# Altium schematic symbol library Capacitor - Aluminium TH.SchLib: 4591 symbols (part 4 of 27) (continued)
## 860160275035
designator C?, comment 1800uF  (value not drawn)
CAP 1800 UF 20% 10 V; Part Number: 860160275035; Manufacturer: Wurth Electronics Inc; TemperatureRange: -55C ~ 105C; Voltage: 10V; Type: Polar; Ripple Current: 1.65A @ 100kHz; Impedance: 102 mOhm; Value: 1800uF; PartId: 26047; Supplier 1: Digi-Key; Supplier Part Number 1: 732-9440-3-ND; ComponentLink1Description: Datasheet; ComponentLink1URL: http://katalog.we-online.de/pbs/datasheet/860160275035.pdf; ComponentLink2Description: Digi-Key Listing; ComponentLink2URL: https://www.digikey.com/product-detail/en/wurth-electronics-inc/860160275035/732-9440-3-ND/5727670; Tolerance: 20%; Price: 0.6174; Device Package: Radial, Can, 10mm
footprint CAP AL TH D10 L5 H30
pins: 1, 2

## 860160280045
designator C?, comment 4700uF  (value not drawn)
CAP 4700 UF 20% 10 V; Part Number: 860160280045; Manufacturer: Wurth Electronics Inc; TemperatureRange: -55C ~ 105C; Voltage: 10V; Type: Polar; Ripple Current: 2.634A @ 100kHz; Impedance: 57 mOhm; Value: 4700uF; PartId: 26696; Supplier 1: Digi-Key; Supplier Part Number 1: 732-9450-3-ND; ComponentLink1Description: Datasheet; ComponentLink1URL: http://katalog.we-online.de/pbs/datasheet/860160280045.pdf; ComponentLink2Description: Digi-Key Listing; ComponentLink2URL: https://www.digikey.com/product-detail/en/wurth-electronics-inc/860160280045/732-9450-3-ND/5727680; Tolerance: 20%; Price: 1.8979; Device Package: Radial, Can, 16mm
footprint CAP AL TH D16 L7.5 H26.5
pins: 1, 2

## 860160280047
designator C?, comment 5600uF  (value not drawn)
CAP 5600 UF 20% 10 V; Part Number: 860160280047; Manufacturer: Wurth Electronics Inc; TemperatureRange: -55C ~ 105C; Voltage: 10V; Type: Polar; Ripple Current: 2.736A @ 100kHz; Impedance: 50 mOhm; Value: 5600uF; PartId: 27256; Supplier 1: Digi-Key; Supplier Part Number 1: 732-9452-3-ND; ComponentLink1Description: Datasheet; ComponentLink1URL: http://katalog.we-online.de/pbs/datasheet/860160280047.pdf; ComponentLink2Description: Digi-Key Listing; ComponentLink2URL: https://www.digikey.com/product-detail/en/wurth-electronics-inc/860160280047/732-9452-3-ND/5727682; Tolerance: 20%; Price: 2.7331; Device Package: Radial, Can, 16mm
footprint CAP AL TH D16 L7.5 H33.5
pins: 1, 2

## 860160280048
designator C?, comment 6800uF  (value not drawn)
CAP 6800 UF 20% 10 V; Part Number: 860160280048; Manufacturer: Wurth Electronics Inc; TemperatureRange: -55C ~ 105C; Voltage: 10V; Type: Polar; Ripple Current: 2.964A @ 100kHz; Impedance: 46 mOhm; Value: 6800uF; PartId: 27288; Supplier 1: Digi-Key; Supplier Part Number 1: 732-9453-3-ND; ComponentLink1Description: Datasheet; ComponentLink1URL: http://katalog.we-online.de/pbs/datasheet/860160280048.pdf; ComponentLink2Description: Digi-Key Listing; ComponentLink2URL: https://www.digikey.com/product-detail/en/wurth-electronics-inc/860160280048/732-9453-3-ND/5727683; Tolerance: 20%; Price: 3.2803; Device Package: Radial, Can, 16mm
footprint CAP AL TH D16 L7.5 H33.5
pins: 1, 2

## 860160375023
designator C?, comment 390uF  (value not drawn)
CAP 390 UF 20% 16 V; Part Number: 860160375023; Manufacturer: Wurth Electronics Inc; TemperatureRange: -55C ~ 105C; Voltage: 16V; Type: Polar; Ripple Current: 648mA @ 100kHz; Impedance: 330 mOhm; Value: 390uF; PartId: 24891; Supplier 1: Digi-Key; Supplier Part Number 1: 732-9476-1-ND; ComponentLink1Description: Datasheet; ComponentLink1URL: http://katalog.we-online.de/pbs/datasheet/860160375023.pdf; ComponentLink2Description: Digi-Key Listing; ComponentLink2URL: https://www.digikey.com/product-detail/en/wurth-electronics-inc/860160375023/732-9476-1-ND/5729414; Tolerance: 20%; Price: 0.48; Device Package: Radial, Can, 10mm
footprint CAP AL TH D10 L5 H14.5
pins: 1, 2

## 860160375025
designator C?, comment 470uF  (value not drawn)
CAP 470 UF 20% 16 V; Part Number: 860160375025; Manufacturer: Wurth Electronics Inc; TemperatureRange: -55C ~ 105C; Voltage: 16V; Type: Polar; Ripple Current: 882mA @ 100kHz; Impedance: 280 mOhm; Value: 470uF; PartId: 24981; Supplier 1: Digi-Key; Supplier Part Number 1: 732-9478-1-ND; ComponentLink1Description: Datasheet; ComponentLink1URL: http://katalog.we-online.de/pbs/datasheet/860160375025.pdf; ComponentLink2Description: Digi-Key Listing; ComponentLink2URL: https://www.digikey.com/product-detail/en/wurth-electronics-inc/860160375025/732-9478-1-ND/5729416; Tolerance: 20%; Price: 0.54; Device Package: Radial, Can, 10mm
footprint CAP AL TH D10 L5 H14.5
pins: 1, 2

## 860160375027
designator C?, comment 560uF  (value not drawn)
CAP 560 UF 20% 16 V; Part Number: 860160375027; Manufacturer: Wurth Electronics Inc; TemperatureRange: -55C ~ 105C; Voltage: 16V; Type: Polar; Ripple Current: 882mA @ 100kHz; Impedance: 240 mOhm; Value: 560uF; PartId: 24680; Supplier 1: Digi-Key; Supplier Part Number 1: 732-9480-3-ND; ComponentLink1Description: Datasheet; ComponentLink1URL: http://katalog.we-online.de/pbs/datasheet/860160375027.pdf; ComponentLink2Description: Digi-Key Listing; ComponentLink2URL: https://www.digikey.com/product-detail/en/wurth-electronics-inc/860160375027/732-9480-3-ND/5727710; Tolerance: 20%; Price: 0.3276; Device Package: Radial, Can, 10mm
footprint CAP AL TH D10 L5 H14.5
pins: 1, 2

## 860160375029
designator C?, comment 680uF  (value not drawn)
CAP 680 UF 20% 16 V; Part Number: 860160375029; Manufacturer: Wurth Electronics Inc; TemperatureRange: -55C ~ 105C; Voltage: 16V; Type: Polar; Ripple Current: 1.044A @ 100kHz; Impedance: 180 mOhm; Value: 680uF; PartId: 25137; Supplier 1: Digi-Key; Supplier Part Number 1: 732-9482-3-ND; ComponentLink1Description: Datasheet; ComponentLink1URL: http://katalog.we-online.de/pbs/datasheet/860160375029.pdf; ComponentLink2Description: Digi-Key Listing; ComponentLink2URL: https://www.digikey.com/product-detail/en/wurth-electronics-inc/860160375029/732-9482-3-ND/5727712; Tolerance: 20%; Price: 0.3729; Device Package: Radial, Can, 10mm
footprint CAP AL TH D10 L5 H17.5
pins: 1, 2

## 860160375031
designator C?, comment 820uF  (value not drawn)
CAP 820 UF 20% 16 V; Part Number: 860160375031; Manufacturer: Wurth Electronics Inc; TemperatureRange: -55C ~ 105C; Voltage: 16V; Type: Polar; Ripple Current: 1.254A @ 100kHz; Impedance: 150 mOhm; Value: 820uF; PartId: 25143; Supplier 1: Digi-Key; Supplier Part Number 1: 732-9484-3-ND; ComponentLink1Description: Datasheet; ComponentLink1URL: http://katalog.we-online.de/pbs/datasheet/860160375031.pdf; ComponentLink2Description: Digi-Key Listing; ComponentLink2URL: https://www.digikey.com/product-detail/en/wurth-electronics-inc/860160375031/732-9484-3-ND/5727714; Tolerance: 20%; Price: 0.4032; Device Package: Radial, Can, 10mm
footprint CAP AL TH D10 L5 H17.5
pins: 1, 2

## 860160375034
designator C?, comment 1500uF  (value not drawn)
CAP 1500 UF 20% 16 V; Part Number: 860160375034; Manufacturer: Wurth Electronics Inc; TemperatureRange: -55C ~ 105C; Voltage: 16V; Type: Polar; Ripple Current: 1.62A @ 100kHz; Impedance: 96 mOhm; Value: 1500uF; PartId: 26083; Supplier 1: Digi-Key; Supplier Part Number 1: 732-9487-3-ND; ComponentLink1Description: Datasheet; ComponentLink1URL: http://katalog.we-online.de/pbs/datasheet/860160375034.pdf; ComponentLink2Description: Digi-Key Listing; ComponentLink2URL: https://www.digikey.com/product-detail/en/wurth-electronics-inc/860160375034/732-9487-3-ND/5727717; Tolerance: 20%; Price: 0.7207; Device Package: Radial, Can, 10mm
footprint CAP AL TH D10 L5 H30
pins: 1, 2

## 860160380041
designator C?, comment 3300uF  (value not drawn)
CAP 3300 UF 20% 16 V; Part Number: 860160380041; Manufacturer: Wurth Electronics Inc; TemperatureRange: -55C ~ 105C; Voltage: 16V; Type: Polar; Ripple Current: 2.7A @ 100kHz; Impedance: 64 mOhm; Value: 3300uF; PartId: 26598; Supplier 1: Digi-Key; Supplier Part Number 1: 732-9494-3-ND; ComponentLink1Description: Datasheet; ComponentLink1URL: http://katalog.we-online.de/pbs/datasheet/860160380041.pdf; ComponentLink2Description: Digi-Key Listing; ComponentLink2URL: https://www.digikey.com/product-detail/en/wurth-electronics-inc/860160380041/732-9494-3-ND/5727724; Tolerance: 20%; Price: 1.3248; Device Package: Radial, Can, 16mm
footprint CAP AL TH D16 L7.5 H26.5
pins: 1, 2

## 860160380043
designator C?, comment 3900uF  (value not drawn)
CAP 3900 UF 20% 16 V; Part Number: 860160380043; Manufacturer: Wurth Electronics Inc; TemperatureRange: -55C ~ 105C; Voltage: 16V; Type: Polar; Ripple Current: 2.736A @ 100kHz; Impedance: 60 mOhm; Value: 3900uF; PartId: 26687; Supplier 1: Digi-Key; Supplier Part Number 1: 732-9496-3-ND; ComponentLink1Description: Datasheet; ComponentLink1URL: http://katalog.we-online.de/pbs/datasheet/860160380043.pdf; ComponentLink2Description: Digi-Key Listing; ComponentLink2URL: https://www.digikey.com/product-detail/en/wurth-electronics-inc/860160380043/732-9496-3-ND/5727726; Tolerance: 20%; Price: 1.8173; Device Package: Radial, Can, 16mm
footprint CAP AL TH D16 L7.5 H26.5
pins: 1, 2

## 860160475020
designator C?, comment 330uF  (value not drawn)
CAP 330 UF 20% 25 V; Part Number: 860160475020; Manufacturer: Wurth Electronics Inc; TemperatureRange: -55C ~ 105C; Voltage: 25V; Type: Polar; Ripple Current: 924mA @ 100kHz; Impedance: 240 mOhm; Value: 330uF; PartId: 24943; Supplier 1: Digi-Key; Supplier Part Number 1: 732-9520-1-ND; ComponentLink1Description: Datasheet; ComponentLink1URL: http://katalog.we-online.de/pbs/datasheet/860160475020.pdf; ComponentLink2Description: Digi-Key Listing; ComponentLink2URL: https://www.digikey.com/product-detail/en/wurth-electronics-inc/860160475020/732-9520-1-ND/5729458; Tolerance: 20%; Price: 0.51; Device Package: Radial, Can, 10mm
footprint CAP AL TH D10 L5 H14.5
pins: 1, 2

## 860160480032
designator C?, comment 1800uF  (value not drawn)
CAP 1800 UF 20% 25 V; Part Number: 860160480032; Manufacturer: Wurth Electronics Inc; TemperatureRange: -55C ~ 105C; Voltage: 25V; Type: Polar; Ripple Current: 2.34A @ 100kHz; Impedance: 58 mOhm; Value: 1800uF; PartId: 26647; Supplier 1: Digi-Key; Supplier Part Number 1: 732-9532-3-ND; ComponentLink1Description: Datasheet; ComponentLink1URL: http://katalog.we-online.de/pbs/datasheet/860160480032.pdf; ComponentLink2Description: Digi-Key Listing; ComponentLink2URL: https://www.digikey.com/product-detail/en/wurth-electronics-inc/860160480032/732-9532-3-ND/5727762; Tolerance: 20%; Price: 1.5321; Device Package: Radial, Can, 16mm
footprint CAP AL TH D16 L7.5 H26.5
pins: 1, 2

## 860160480037
designator C?, comment 3300uF  (value not drawn)
CAP 3300 UF 20% 25 V; Part Number: 860160480037; Manufacturer: Wurth Electronics Inc; TemperatureRange: -55C ~ 105C; Voltage: 25V; Type: Polar; Ripple Current: 3.204A @ 100kHz; Impedance: 38 mOhm; Value: 3300uF; PartId: 27236; Supplier 1: Digi-Key; Supplier Part Number 1: 732-9537-3-ND; ComponentLink1Description: Datasheet; ComponentLink1URL: http://katalog.we-online.de/pbs/datasheet/860160480037.pdf; ComponentLink2Description: Digi-Key Listing; ComponentLink2URL: https://www.digikey.com/product-detail/en/wurth-electronics-inc/860160480037/732-9537-3-ND/5727767; Tolerance: 20%; Price: 2.4998; Device Package: Radial, Can, 16mm
footprint CAP AL TH D16 L7.5 H33.5
pins: 1, 2

## 860160575016
designator C?, comment 150uF  (value not drawn)
CAP 150 UF 20% 35 V; Part Number: 860160575016; Manufacturer: Wurth Electronics Inc; TemperatureRange: -55C ~ 105C; Voltage: 35V; Type: Polar; Ripple Current: 720mA @ 100kHz; Impedance: 350 mOhm; Value: 150uF; PartId: 24970; Supplier 1: Digi-Key; Supplier Part Number 1: 732-9554-1-ND; ComponentLink1Description: Datasheet; ComponentLink1URL: http://katalog.we-online.de/pbs/datasheet/860160575016.pdf; ComponentLink2Description: Digi-Key Listing; ComponentLink2URL: https://www.digikey.com/product-detail/en/wurth-electronics-inc/860160575016/732-9554-1-ND/5729492; Tolerance: 20%; Price: 0.53; Device Package: Radial, Can, 10mm
footprint CAP AL TH D10 L5 H14.5
pins: 1, 2

## 860160575018
designator C?, comment 180uF  (value not drawn)
CAP 180 UF 20% 35 V; Part Number: 860160575018; Manufacturer: Wurth Electronics Inc; TemperatureRange: -55C ~ 105C; Voltage: 35V; Type: Polar; Ripple Current: 804mA @ 100kHz; Impedance: 320 mOhm; Value: 180uF; PartId: 24673; Supplier 1: Digi-Key; Supplier Part Number 1: 732-9556-3-ND; ComponentLink1Description: Datasheet; ComponentLink1URL: http://katalog.we-online.de/pbs/datasheet/860160575018.pdf; ComponentLink2Description: Digi-Key Listing; ComponentLink2URL: https://www.digikey.com/product-detail/en/wurth-electronics-inc/860160575018/732-9556-3-ND/5727786; Tolerance: 20%; Price: 0.3099; Device Package: Radial, Can, 10mm
footprint CAP AL TH D10 L5 H14.5
pins: 1, 2

## 860160575020
designator C?, comment 220uF  (value not drawn)
CAP 220 UF 20% 35 V; Part Number: 860160575020; Manufacturer: Wurth Electronics Inc; TemperatureRange: -55C ~ 105C; Voltage: 35V; Type: Polar; Ripple Current: 888mA @ 100kHz; Impedance: 240 mOhm; Value: 220uF; PartId: 24971; Supplier 1: Digi-Key; Supplier Part Number 1: 732-9558-1-ND; ComponentLink1Description: Datasheet; ComponentLink1URL: http://katalog.we-online.de/pbs/datasheet/860160575020.pdf; ComponentLink2Description: Digi-Key Listing; ComponentLink2URL: https://www.digikey.com/product-detail/en/wurth-electronics-inc/860160575020/732-9558-1-ND/5729496; Tolerance: 20%; Price: 0.53; Device Package: Radial, Can, 10mm
footprint CAP AL TH D10 L5 H14.5
pins: 1, 2

## 860160575026
designator C?, comment 560uF  (value not drawn)
CAP 560 UF 20% 35 V; Part Number: 860160575026; Manufacturer: Wurth Electronics Inc; TemperatureRange: -55C ~ 105C; Voltage: 35V; Type: Polar; Ripple Current: 1.572A @ 100kHz; Impedance: 96 mOhm; Value: 560uF; PartId: 26046; Supplier 1: Digi-Key; Supplier Part Number 1: 732-9564-3-ND; ComponentLink1Description: Datasheet; ComponentLink1URL: http://katalog.we-online.de/pbs/datasheet/860160575026.pdf; ComponentLink2Description: Digi-Key Listing; ComponentLink2URL: https://www.digikey.com/product-detail/en/wurth-electronics-inc/860160575026/732-9564-3-ND/5727794; Tolerance: 20%; Price: 0.6123; Device Package: Radial, Can, 10mm
footprint CAP AL TH D10 L5 H30
pins: 1, 2

## 860160580037
designator C?, comment 1800uF  (value not drawn)
CAP 1800 UF 20% 35 V; Part Number: 860160580037; Manufacturer: Wurth Electronics Inc; TemperatureRange: -55C ~ 105C; Voltage: 35V; Type: Polar; Ripple Current: 3.012A @ 100kHz; Impedance: 45 mOhm; Value: 1800uF; PartId: 27189; Supplier 1: Digi-Key; Supplier Part Number 1: 732-9575-3-ND; ComponentLink1Description: Datasheet; ComponentLink1URL: http://katalog.we-online.de/pbs/datasheet/860160580037.pdf; ComponentLink2Description: Digi-Key Listing; ComponentLink2URL: https://www.digikey.com/product-detail/en/wurth-electronics-inc/860160580037/732-9575-3-ND/5727805; Tolerance: 20%; Price: 2.0217; Device Package: Radial, Can, 16mm
footprint CAP AL TH D16 L7.5 H33.5
pins: 1, 2

## 860160580038
designator C?, comment 2200uF  (value not drawn)
CAP 2200 UF 20% 35 V; Part Number: 860160580038; Manufacturer: Wurth Electronics Inc; TemperatureRange: -55C ~ 105C; Voltage: 35V; Type: Polar; Ripple Current: 3.228A @ 100kHz; Impedance: 36 mOhm; Value: 2200uF; PartId: 27228; Supplier 1: Digi-Key; Supplier Part Number 1: 732-9576-3-ND; ComponentLink1Description: Datasheet; ComponentLink1URL: http://katalog.we-online.de/pbs/datasheet/860160580038.pdf; ComponentLink2Description: Digi-Key Listing; ComponentLink2URL: https://www.digikey.com/product-detail/en/wurth-electronics-inc/860160580038/732-9576-3-ND/5727806; Tolerance: 20%; Price: 2.4249; Device Package: Radial, Can, 16mm
footprint CAP AL TH D16 L7.5 H33.5
pins: 1, 2

## 860160680034
designator C?, comment 1000uF  (value not drawn)
CAP 1000 UF 20% 50 V; Part Number: 860160680034; Manufacturer: Wurth Electronics Inc; TemperatureRange: -55C ~ 105C; Voltage: 50V; Type: Polar; Ripple Current: 2.676A @ 100kHz; Impedance: 50 mOhm; Value: 1000uF; PartId: 26692; Supplier 1: Digi-Key; Supplier Part Number 1: 732-9612-3-ND; ComponentLink1Description: Datasheet; ComponentLink1URL: http://katalog.we-online.de/pbs/datasheet/860160680034.pdf; ComponentLink2Description: Digi-Key Listing; ComponentLink2URL: https://www.digikey.com/product-detail/en/wurth-electronics-inc/860160680034/732-9612-3-ND/5727842; Tolerance: 20%; Price: 1.8461; Device Package: Radial, Can, 16mm
footprint CAP AL TH D16 L7.5 H26.5
pins: 1, 2

## 860160680035
designator C?, comment 1200uF  (value not drawn)
CAP 1200 UF 20% 50 V; Part Number: 860160680035; Manufacturer: Wurth Electronics Inc; TemperatureRange: -55C ~ 105C; Voltage: 50V; Type: Polar; Ripple Current: 2.952A @ 100kHz; Impedance: 45 mOhm; Value: 1200uF; PartId: 27258; Supplier 1: Digi-Key; Supplier Part Number 1: 732-9613-3-ND; ComponentLink1Description: Datasheet; ComponentLink1URL: http://katalog.we-online.de/pbs/datasheet/860160680035.pdf; ComponentLink2Description: Digi-Key Listing; ComponentLink2URL: https://www.digikey.com/product-detail/en/wurth-electronics-inc/860160680035/732-9613-3-ND/5727843; Tolerance: 20%; Price: 2.7964; Device Package: Radial, Can, 16mm
footprint CAP AL TH D16 L7.5 H33.5
pins: 1, 2

## 860240275007
designator C?, comment 470uF  (value not drawn)
CAP 470 UF 20% 10 V; Part Number: 860240275007; Manufacturer: Wurth Electronics Inc; TemperatureRange: -40C ~ 105C; Voltage: 10V; Type: Polar; Ripple Current: 540mA @ 100kHz; Value: 470uF; PartId: 24790; Supplier 1: Digi-Key; Supplier Part Number 1: 732-9312-1-ND; ComponentLink1Description: Datasheet; ComponentLink1URL: http://katalog.we-online.de/pbs/datasheet/860240275007.pdf; ComponentLink2Description: Digi-Key Listing; ComponentLink2URL: https://www.digikey.com/product-detail/en/wurth-electronics-inc/860240275007/732-9312-1-ND/5729250; Tolerance: 20%; Price: 0.44; Device Package: Radial, Can, 10mm
footprint CAP AL TH D10 L5 H14.5
pins: 1, 2

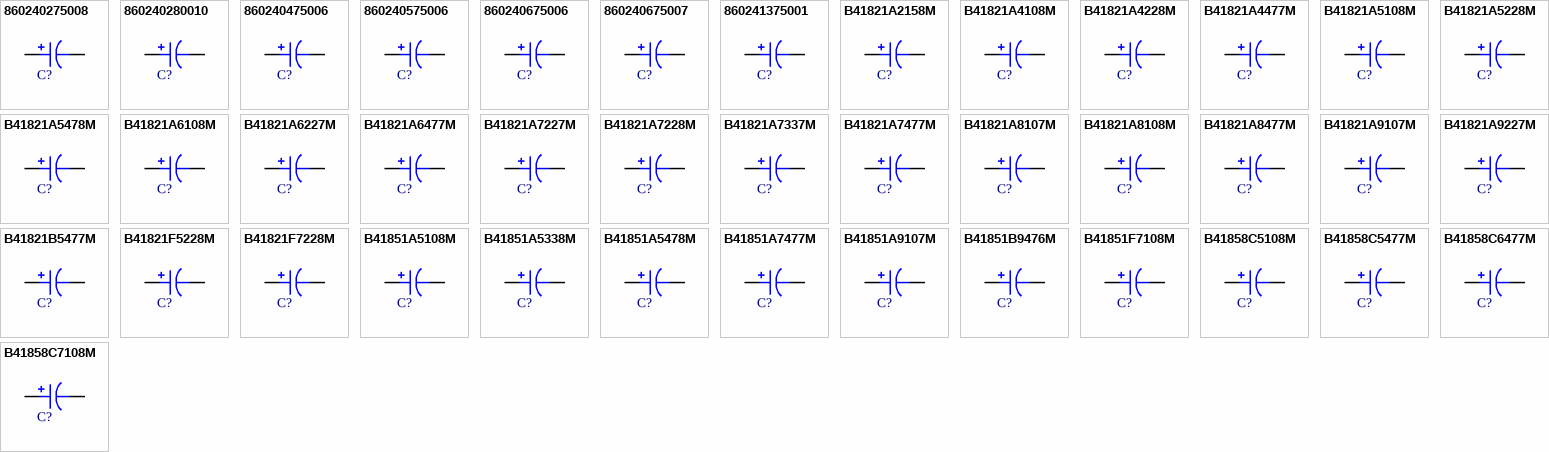
[diagram p17: symbols 860240275008 to B41858C7108M]

## 860240275008
designator C?, comment 1000uF  (value not drawn)
CAP 1000 UF 20% 10 V; Part Number: 860240275008; Manufacturer: Wurth Electronics Inc; TemperatureRange: -40C ~ 105C; Voltage: 10V; Type: Polar; Ripple Current: 900mA @ 100kHz; Value: 1000uF; PartId: 25141; Supplier 1: Digi-Key; Supplier Part Number 1: 732-9313-3-ND; ComponentLink1Description: Datasheet; ComponentLink1URL: http://katalog.we-online.de/pbs/datasheet/860240275008.pdf; ComponentLink2Description: Digi-Key Listing; ComponentLink2URL: https://www.digikey.com/product-detail/en/wurth-electronics-inc/860240275008/732-9313-3-ND/5727543; Tolerance: 20%; Price: 0.388; Device Package: Radial, Can, 10mm
footprint CAP AL TH D10 L5 H17.5
pins: 1, 2

## 860240280010
designator C?, comment 3300uF  (value not drawn)
CAP 3300 UF 20% 10 V; Part Number: 860240280010; Manufacturer: Wurth Electronics Inc; TemperatureRange: -40C ~ 105C; Voltage: 10V; Type: Polar; Ripple Current: 1.9A @ 100kHz; Value: 3300uF; PartId: 26654; Supplier 1: Digi-Key; Supplier Part Number 1: 732-9315-3-ND; ComponentLink1Description: Datasheet; ComponentLink1URL: http://katalog.we-online.de/pbs/datasheet/860240280010.pdf; ComponentLink2Description: Digi-Key Listing; ComponentLink2URL: https://www.digikey.com/product-detail/en/wurth-electronics-inc/860240280010/732-9315-3-ND/5727545; Tolerance: 20%; Price: 1.5753; Device Package: Radial, Can, 16mm
footprint CAP AL TH D16 L7.5 H26.5
pins: 1, 2

## 860240475006
designator C?, comment 150uF  (value not drawn)
CAP 150 UF 20% 25 V; Part Number: 860240475006; Manufacturer: Wurth Electronics Inc; TemperatureRange: -40C ~ 105C; Voltage: 25V; Type: Polar; Ripple Current: 460mA @ 100kHz; Value: 150uF; PartId: 24955; Supplier 1: Digi-Key; Supplier Part Number 1: 732-9282-1-ND; ComponentLink1Description: Datasheet; ComponentLink1URL: http://katalog.we-online.de/pbs/datasheet/860240475006.pdf; ComponentLink2Description: Digi-Key Listing; ComponentLink2URL: https://www.digikey.com/product-detail/en/wurth-electronics-inc/860240475006/732-9282-1-ND/5729220; Tolerance: 20%; Price: 0.52; Device Package: Radial, Can, 10mm
footprint CAP AL TH D10 L5 H14.5
pins: 1, 2

## 860240575006
designator C?, comment 100uF  (value not drawn)
CAP 100 UF 20% 35 V; Part Number: 860240575006; Manufacturer: Wurth Electronics Inc; TemperatureRange: -40C ~ 105C; Voltage: 35V; Type: Polar; Ripple Current: 390mA @ 100kHz; Value: 100uF; PartId: 24958; Supplier 1: Digi-Key; Supplier Part Number 1: 732-9321-1-ND; ComponentLink1Description: Datasheet; ComponentLink1URL: http://katalog.we-online.de/pbs/datasheet/860240575006.pdf; ComponentLink2Description: Digi-Key Listing; ComponentLink2URL: https://www.digikey.com/product-detail/en/wurth-electronics-inc/860240575006/732-9321-1-ND/5729259; Tolerance: 20%; Price: 0.52; Device Package: Radial, Can, 10mm
footprint CAP AL TH D10 L5 H14.5
pins: 1, 2

## 860240675006
designator C?, comment 68uF  (value not drawn)
CAP 68 UF 20% 50 V; Part Number: 860240675006; Manufacturer: Wurth Electronics Inc; TemperatureRange: -40C ~ 105C; Voltage: 50V; Type: Polar; Ripple Current: 356mA @ 100kHz; Value: 68uF; PartId: 24788; Supplier 1: Digi-Key; Supplier Part Number 1: 732-9293-1-ND; ComponentLink1Description: Datasheet; ComponentLink1URL: http://katalog.we-online.de/pbs/datasheet/860240675006.pdf; ComponentLink2Description: Digi-Key Listing; ComponentLink2URL: https://www.digikey.com/product-detail/en/wurth-electronics-inc/860240675006/732-9293-1-ND/5729231; Tolerance: 20%; Price: 0.44; Device Package: Radial, Can, 10mm
footprint CAP AL TH D10 L5 H14.5
pins: 1, 2

## 860240675007
designator C?, comment 100uF  (value not drawn)
CAP 100 UF 20% 50 V; Part Number: 860240675007; Manufacturer: Wurth Electronics Inc; TemperatureRange: -40C ~ 105C; Voltage: 50V; Type: Polar; Ripple Current: 500mA @ 100kHz; Value: 100uF; PartId: 25133; Supplier 1: Digi-Key; Supplier Part Number 1: 732-9294-3-ND; ComponentLink1Description: Datasheet; ComponentLink1URL: http://katalog.we-online.de/pbs/datasheet/860240675007.pdf; ComponentLink2Description: Digi-Key Listing; ComponentLink2URL: https://www.digikey.com/product-detail/en/wurth-electronics-inc/860240675007/732-9294-3-ND/5727524; Tolerance: 20%; Price: 0.3578; Device Package: Radial, Can, 10mm
footprint CAP AL TH D10 L5 H17.5
pins: 1, 2

## 860241375001
designator C?, comment 6.8uF  (value not drawn)
CAP 6.8 UF 20% 400 V; Part Number: 860241375001; Manufacturer: Wurth Electronics Inc; TemperatureRange: -25C ~ 105C; Voltage: 400V; Type: Polar; Ripple Current: 220mA @ 100kHz; Value: 6.8uF; PartId: 24720; Supplier 1: Digi-Key; Supplier Part Number 1: 732-9300-3-ND; ComponentLink1Description: Datasheet; ComponentLink1URL: http://katalog.we-online.de/pbs/datasheet/860241375001.pdf; ComponentLink2Description: Digi-Key Listing; ComponentLink2URL: https://www.digikey.com/product-detail/en/wurth-electronics-inc/860241375001/732-9300-3-ND/5727530; Tolerance: 20%; Price: 0.4057; Device Package: Radial, Can, 10mm
footprint CAP AL TH D10 L5 H14.5
pins: 1, 2

## B41821A2158M
designator C?, comment 1500uF  (value not drawn)
CAP ALUM 1500UF 20% 6.3V RADIAL; Part Number: B41821A2158M; Manufacturer: EPCOS (TDK); Type: Polar; Ripple Current: 750mA @ 120Hz; Value: 1500uF; PartId: 25189; Supplier 1: Digi-Key; Supplier Part Number 1: 495-5980-ND; ComponentLink1Description: Datasheet; ComponentLink1URL: http://en.tdk.eu/inf/20/30/db/aec_2013/B41821_B43821.pdf; ComponentLink2Description: Digi-Key Listing; ComponentLink2URL: https://www.digikey.com/product-detail/en/epcos-tdk/B41821A2158M/495-5980-ND/3543469; Tolerance: 20%; Voltage: 6.3V; Price: 0.48; Device Package: Radial, Can, 10mm
footprint CAP AL TH D10 L5 H17.5
pins: 1, 2

## B41821A4108M
designator C?, comment 1000uF  (value not drawn)
CAP ALUM 1000UF 20% 16V RADIAL; Part Number: B41821A4108M; Manufacturer: EPCOS (TDK); TemperatureRange: -40C ~ 85C; Type: Polar; Ripple Current: 790mA @ 120Hz; Value: 1000uF; PartId: 25211; Supplier 1: Digi-Key; Supplier Part Number 1: 495-5981-ND; ComponentLink1Description: Datasheet; ComponentLink1URL: http://en.tdk.eu/inf/20/30/db/aec_2013/B41821_B43821.pdf; ComponentLink2Description: Digi-Key Listing; ComponentLink2URL: https://www.digikey.com/product-detail/en/epcos-tdk/B41821A4108M/495-5981-ND/3543484; Tolerance: 20%; Voltage: 16V; Price: 0.52; Device Package: Radial, Can, 10mm
footprint CAP AL TH D10 L5 H17.5
pins: 1, 2

## B41821A4228M
designator C?, comment 2200uF  (value not drawn)
CAP ALUM 2200UF 20% 16V RADIAL; Part Number: B41821A4228M; Manufacturer: EPCOS (TDK); TemperatureRange: -40C ~ 85C; Type: Polar; Value: 2200uF; PartId: 23956; Supplier 1: Digi-Key; Supplier Part Number 1: 495-6046-ND; ComponentLink1Description: Datasheet; ComponentLink1URL: http://en.tdk.eu/inf/20/30/db/aec_2013/B41821_B43821.pdf; ComponentLink2Description: Digi-Key Listing; ComponentLink2URL: https://www.digikey.com/product-detail/en/epcos-tdk/B41821A4228M/495-6046-ND/3544301; Tolerance: 20%; Voltage: 16V; Price: 0.98; Device Package: Radial, Can, 12.5mm
footprint CAP AL TH D12.5 L5 H27
pins: 1, 2

## B41821A4477M
designator C?, comment 470uF  (value not drawn)
CAP ALUM 470UF 20% 16V RADIAL; Part Number: B41821A4477M; Manufacturer: EPCOS (TDK); TemperatureRange: -40C ~ 85C; Type: Polar; Value: 470uF; PartId: 24874; Supplier 1: Digi-Key; Supplier Part Number 1: 495-5982-ND; ComponentLink1Description: Datasheet; ComponentLink1URL: http://en.tdk.eu/inf/20/30/db/aec_2013/B41821_B43821.pdf; ComponentLink2Description: Digi-Key Listing; ComponentLink2URL: https://www.digikey.com/product-detail/en/epcos-tdk/B41821A4477M/495-5982-ND/3543492; Tolerance: 20%; Voltage: 16V; Price: 0.48; Device Package: Radial, Can, 10mm
footprint CAP AL TH D10 L5 H14.5
pins: 1, 2

## B41821A5108M
designator C?, comment 1000uF  (value not drawn)
CAP ALUM 1000UF 20% 25V RADIAL; Part Number: B41821A5108M; Manufacturer: EPCOS (TDK); TemperatureRange: -40C ~ 85C; Type: Polar; Ripple Current: 960mA @ 120Hz; Value: 1000uF; PartId: 25861; Supplier 1: Digi-Key; Supplier Part Number 1: 495-6021-ND; ComponentLink1Description: Datasheet; ComponentLink1URL: http://en.tdk.eu/inf/20/30/db/aec_2013/B41821_B43821.pdf; ComponentLink2Description: Digi-Key Listing; ComponentLink2URL: https://www.digikey.com/product-detail/en/epcos-tdk/B41821A5108M/495-6021-ND/3543826; Tolerance: 20%; Voltage: 25V; Price: 0.6; Device Package: Radial, Can, 10mm
footprint CAP AL TH D10 L5 H22
pins: 1, 2

## B41821A5228M
designator C?, comment 2200uF  (value not drawn)
CAP ALUM 2200UF 20% 25V RADIAL; Part Number: B41821A5228M; Manufacturer: EPCOS (TDK); TemperatureRange: -40C ~ 85C; Type: Polar; Ripple Current: 1.55A @ 120Hz; Value: 2200uF; PartId: 26446; Supplier 1: Digi-Key; Supplier Part Number 1: 495-6048-ND; ComponentLink1Description: Datasheet; ComponentLink1URL: http://en.tdk.eu/inf/20/30/db/aec_2013/B41821_B43821.pdf; ComponentLink2Description: Digi-Key Listing; ComponentLink2URL: https://www.digikey.com/product-detail/en/epcos-tdk/B41821A5228M/495-6048-ND/3544305; Tolerance: 20%; Voltage: 25V; Price: 1.46; Device Package: Radial, Can, 16mm
footprint CAP AL TH D16 L7.5 H22
pins: 1, 2

## B41821A5478M
designator C?, comment 4700uF  (value not drawn)
CAP ALUM 4700UF 20% 25V RADIAL; Part Number: B41821A5478M; Manufacturer: EPCOS (TDK); TemperatureRange: -40C ~ 85C; Type: Polar; Ripple Current: 2.45A @ 120Hz; Value: 4700uF; PartId: 27044; Supplier 1: Digi-Key; Supplier Part Number 1: 495-6074-ND; ComponentLink1Description: Datasheet; ComponentLink1URL: http://en.tdk.eu/inf/20/30/db/aec_2013/B41821_B43821.pdf; ComponentLink2Description: Digi-Key Listing; ComponentLink2URL: https://www.digikey.com/product-detail/en/epcos-tdk/B41821A5478M/495-6074-ND/3544592; Tolerance: 20%; Voltage: 25V; Price: 1.55; Device Package: Radial, Can, 16mm
footprint CAP AL TH D16 L7.5 H33.5
pins: 1, 2

## B41821A6108M
designator C?, comment 1000uF  (value not drawn)
CAP ALUM 1000UF 20% 50V RADIAL; Part Number: B41821A6108M; Manufacturer: EPCOS (TDK); TemperatureRange: -40C ~ 85C; Type: Polar; Ripple Current: 1.35A @ 120Hz; Value: 1000uF; PartId: 26447; Supplier 1: Digi-Key; Supplier Part Number 1: 495-6049-ND; ComponentLink1Description: Datasheet; ComponentLink1URL: http://en.tdk.eu/inf/20/30/db/aec_2013/B41821_B43821.pdf; ComponentLink2Description: Digi-Key Listing; ComponentLink2URL: https://www.digikey.com/product-detail/en/epcos-tdk/B41821A6108M/495-6049-ND/3544307; Tolerance: 20%; Voltage: 50V; Price: 1.48; Device Package: Radial, Can, 16mm
footprint CAP AL TH D16 L7.5 H22
pins: 1, 2

## B41821A6227M
designator C?, comment 220uF  (value not drawn)
CAP ALUM 220UF 20% 50V RADIAL; Part Number: B41821A6227M; Manufacturer: EPCOS (TDK); TemperatureRange: -40C ~ 85C; Type: Polar; Ripple Current: 430mA @ 120Hz; Value: 220uF; PartId: 24879; Supplier 1: Digi-Key; Supplier Part Number 1: 495-5985-ND; ComponentLink1Description: Datasheet; ComponentLink1URL: http://en.tdk.eu/inf/20/30/db/aec_2013/B41821_B43821.pdf; ComponentLink2Description: Digi-Key Listing; ComponentLink2URL: https://www.digikey.com/product-detail/en/epcos-tdk/B41821A6227M/495-5985-ND/3543507; Tolerance: 20%; Voltage: 50V; Price: 0.48; Device Package: Radial, Can, 10mm
footprint CAP AL TH D10 L5 H14.5
pins: 1, 2

## B41821A6477M
designator C?, comment 470uF  (value not drawn)
CAP ALUM 470UF 20% 50V RADIAL; Part Number: B41821A6477M; Manufacturer: EPCOS (TDK); TemperatureRange: -40C ~ 85C; Type: Polar; Ripple Current: 760mA @ 120Hz; Value: 470uF; PartId: 25868; Supplier 1: Digi-Key; Supplier Part Number 1: 495-6022-ND; ComponentLink1Description: Datasheet; ComponentLink1URL: http://en.tdk.eu/inf/20/30/db/aec_2013/B41821_B43821.pdf; ComponentLink2Description: Digi-Key Listing; ComponentLink2URL: https://www.digikey.com/product-detail/en/epcos-tdk/B41821A6477M/495-6022-ND/3543832; Tolerance: 20%; Voltage: 50V; Price: 0.63; Device Package: Radial, Can, 10mm
footprint CAP AL TH D10 L5 H22
pins: 1, 2

## B41821A7227M
designator C?, comment 220uF  (value not drawn)
CAP ALUM 220UF 20% 35V RADIAL; Part Number: B41821A7227M; Manufacturer: EPCOS (TDK); TemperatureRange: -40C ~ 85C; Type: Polar; Ripple Current: 385mA @ 120Hz; Value: 220uF; PartId: 24878; Supplier 1: Digi-Key; Supplier Part Number 1: 495-5987-ND; ComponentLink1Description: Datasheet; ComponentLink1URL: http://en.tdk.eu/inf/20/30/db/aec_2013/B41821_B43821.pdf; ComponentLink2Description: Digi-Key Listing; ComponentLink2URL: https://www.digikey.com/product-detail/en/epcos-tdk/B41821A7227M/495-5987-ND/3543515; Tolerance: 20%; Voltage: 35V; Price: 0.48; Device Package: Radial, Can, 10mm
footprint CAP AL TH D10 L5 H14.5
pins: 1, 2

## B41821A7228M
designator C?, comment 2200uF  (value not drawn)
CAP ALUM 2200UF 20% 35V RADIAL; Part Number: B41821A7228M; Manufacturer: EPCOS (TDK); TemperatureRange: -40C ~ 85C; Type: Polar; Ripple Current: 1.8A @ 120Hz; Value: 2200uF; PartId: 27090; Supplier 1: Digi-Key; Supplier Part Number 1: 495-6075-ND; ComponentLink1Description: Datasheet; ComponentLink1URL: http://en.tdk.eu/inf/20/30/db/aec_2013/B41821_B43821.pdf; ComponentLink2Description: Digi-Key Listing; ComponentLink2URL: https://www.digikey.com/product-detail/en/epcos-tdk/B41821A7228M/495-6075-ND/3544595; Tolerance: 20%; Voltage: 35V; Price: 1.72; Device Package: Radial, Can, 16mm
footprint CAP AL TH D16 L7.5 H33.5
pins: 1, 2

## B41821A7337M
designator C?, comment 330uF  (value not drawn)
CAP ALUM 330UF 20% 35V RADIAL; Part Number: B41821A7337M; Manufacturer: EPCOS (TDK); TemperatureRange: -40C ~ 85C; Type: Polar; Ripple Current: 490mA @ 120Hz; Value: 330uF; PartId: 24877; Supplier 1: Digi-Key; Supplier Part Number 1: 495-5988-ND; ComponentLink1Description: Datasheet; ComponentLink1URL: http://en.tdk.eu/inf/20/30/db/aec_2013/B41821_B43821.pdf; ComponentLink2Description: Digi-Key Listing; ComponentLink2URL: https://www.digikey.com/product-detail/en/epcos-tdk/B41821A7337M/495-5988-ND/3543518; Tolerance: 20%; Voltage: 35V; Price: 0.48; Device Package: Radial, Can, 10mm
footprint CAP AL TH D10 L5 H14.5
pins: 1, 2

## B41821A7477M
designator C?, comment 470uF  (value not drawn)
CAP ALUM 470UF 20% 35V RADIAL; Part Number: B41821A7477M; Manufacturer: EPCOS (TDK); TemperatureRange: -40C ~ 85C; Type: Polar; Ripple Current: 650mA @ 120Hz; Value: 470uF; PartId: 25209; Supplier 1: Digi-Key; Supplier Part Number 1: 495-5976-ND; ComponentLink1Description: Datasheet; ComponentLink1URL: http://en.tdk.eu/inf/20/30/db/aec_2013/B41821_B43821.pdf; ComponentLink2Description: Digi-Key Listing; ComponentLink2URL: https://www.digikey.com/product-detail/en/epcos-tdk/B41821A7477M/495-5976-ND/3543519; Tolerance: 20%; Voltage: 35V; Price: 0.51; Device Package: Radial, Can, 10mm
footprint CAP AL TH D10 L5 H17.5
pins: 1, 2